# Altium integrated library Transistor-SMD_V2.IntLib: 415 symbols (part 2 of 2)
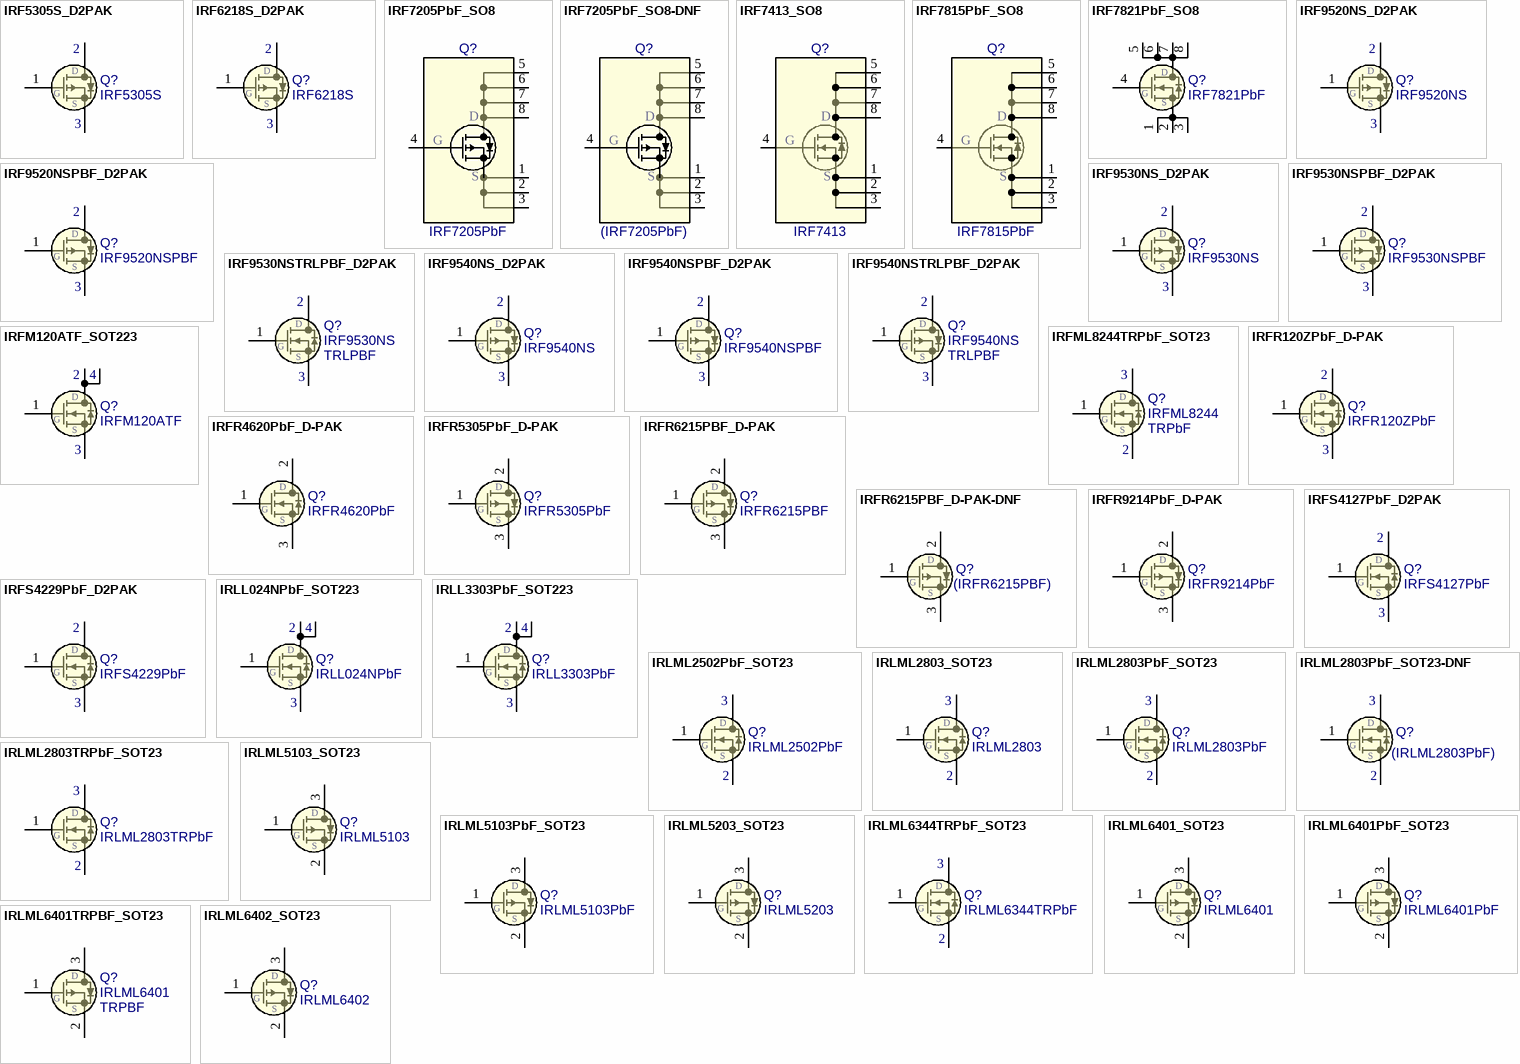
[diagram p11: symbols IRF5305S_D2PAK to IRLML6402_SOT23]

## IRLML6402_SOT23
designator Q?, comment IRLML6402
FET P-Channel 3.7A 20V; Manufacturer: IRF; Package: SOT23; EDM-PN: *; Text2: *; Text1: *; Value: IRLML6402; SAAB PN: *; Part Number: IRLML6402; DCE Part No: *
footprint SOT23 (SOT23, 3-Leads, Body 3.0x1.4mm (max), Pitch 0.95mm, IPC Medium Density)
pins: 1 G, 2 S, 3 D

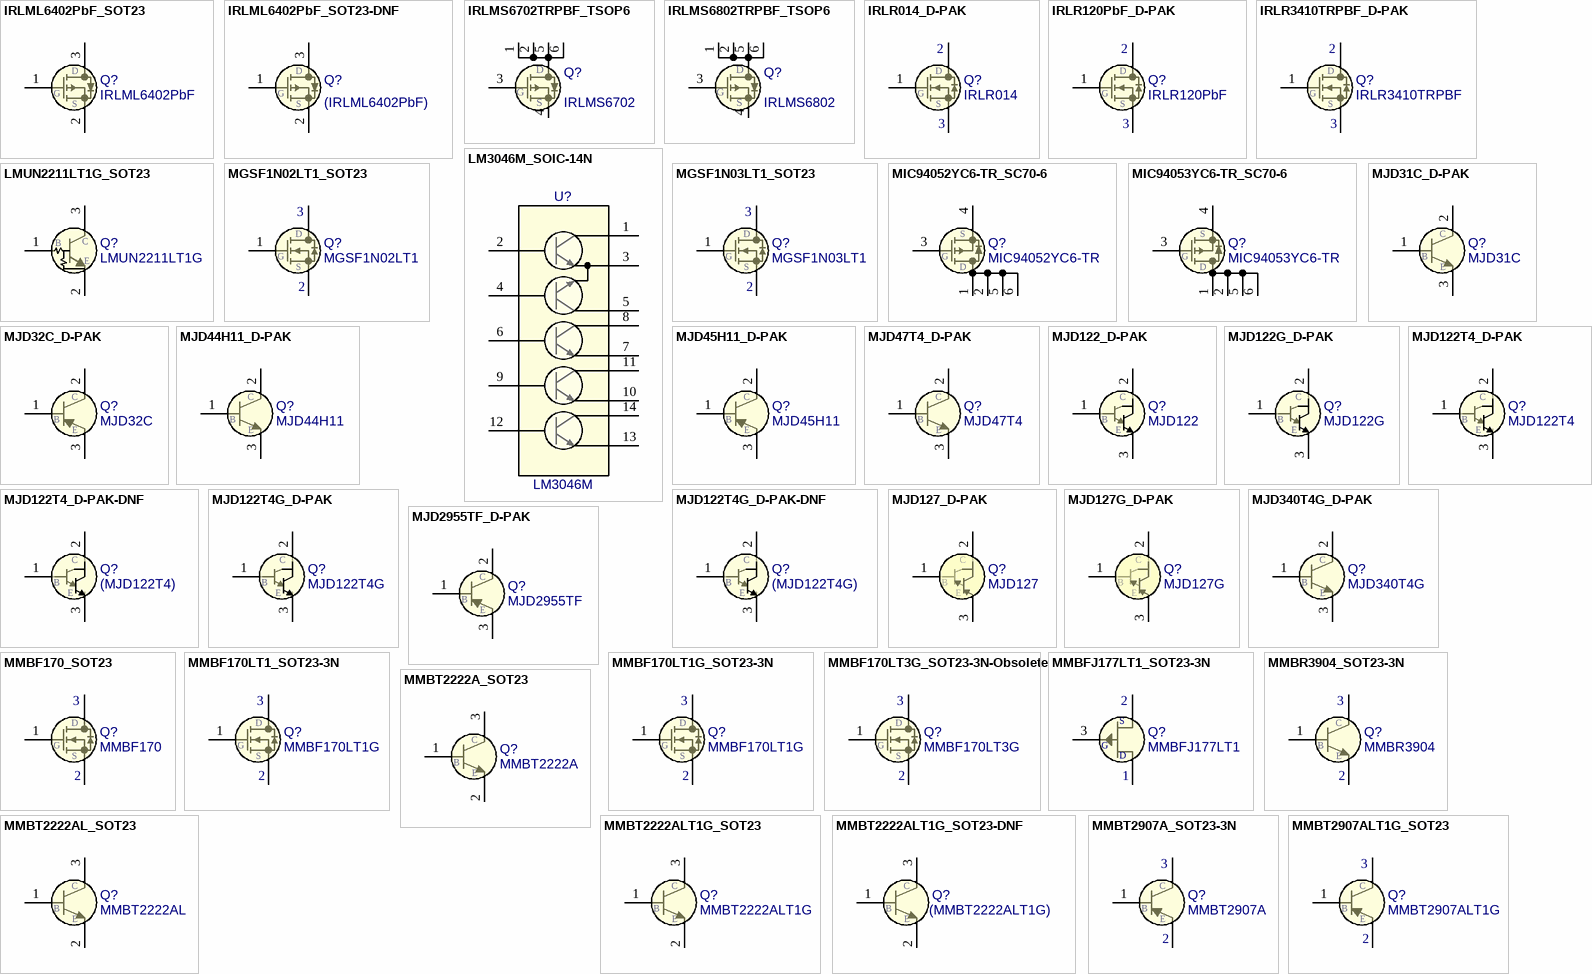
[diagram p6: symbols IRLML6402PbF_SOT23 to MMBT2907ALT1G_SOT23]

## IRLML6402PbF_SOT23
designator Q?, comment IRLML6402PbF
FET P-Channel 3.7A 20V; Manufacturer: IRF; Package: SOT23; EDM-PN: *; Text2: *; Text1: *; Value: IRLML6402PbF; SAAB PN: *; DCE Part No: *; Part Number: IRLML6402PbF
footprint SOT23 (SOT23, 3-Leads, Body 3.0x1.4mm (max), Pitch 0.95mm, IPC Medium Density)
pins: 1 G, 2 S, 3 D

## IRLML6402PbF_SOT23-DNF
designator Q?, comment value (IRLML6402PbF)  (hidden comment: IRLML6402PbF)
FET P-Channel 3.7A 20V - Do not Fit; Manufacturer: IRF; Package: SOT23; EDM-PN: *; Text2: *; Text1: *; SAAB PN: *; Part Number: IRLML6402PbF; DCE Part No: *
footprint SOT23 (SOT23, 3-Leads, Body 3.0x1.4mm (max), Pitch 0.95mm, IPC Medium Density)
pins: 1 G, 2 S, 3 D

## IRLMS6702TRPBF_TSOP6
designator Q?, comment value IRLMS6702  (hidden comment: IRLMS6702TRPBF)
FET P-Channel 20V 2.4A; Manufacturer: Infineon; EDM-PN: FET185; Package: TSOP-6; Text2: *; Text1: *; SAAB PN: *; Part Number: IRLMS6702TRPBF; DCE Part No: *
footprint TSOP-6 (SOT23, 6-Leads, Body 3.0x2.9mm (max), Pitch 0.95mm, IPC Medium Density)
pins: 1 D, 2 D, 3 G, 4 S, 5 D, 6 D

## IRLMS6802TRPBF_TSOP6
designator Q?, comment value IRLMS6802  (hidden comment: IRLMS6802TRPBF)
FET P-Channel 20V 5.6A; Manufacturer: Infineon; EDM-PN: FET186; Package: TSOP-6; Text2: *; Text1: *; SAAB PN: *; Part Number: IRLMS6802TRPBF; DCE Part No: *
footprint TSOP-6 (SOT23, 6-Leads, Body 3.0x2.9mm (max), Pitch 0.95mm, IPC Medium Density)
pins: 1 D, 2 D, 3 G, 4 S, 5 D, 6 D

## IRLR014_D-PAK
designator Q?, comment IRLR014
FET N-Channel 60V 7.7A; Manufacturer: IRF/Vishay; Package: D-PAK-3; EDM-PN: *; Text2: *; Text1: *; Value: IRLR014; SAAB PN: *; DCE Part No: *; Part Number: IRLR014
footprint D-PAK-3 (D-Pak 6.73x6.22mm)
pins: 1 G, 2 D, 3 S

## IRLR120PbF_D-PAK
designator Q?, comment IRLR120PbF
FET N-Channel 100V 7.7A; Manufacturer: Vishay; Package: D-PAK-3; EDM-PN: *; Text2: *; Text1: *; Value: IRLR120PbF; SAAB PN: *; DCE Part No: *; Part Number: IRLR120PbF
footprint D-PAK-3 (D-Pak 6.73x6.22mm)
pins: 1 G, 2 D, 3 S

## IRLR3410TRPBF_D-PAK
designator Q?, comment IRLR3410TRPBF
FET N-Channel 100V 17A; Manufacturer: IRF; Reutech PN: 5961-FE-0088; Package: D-PAK-3; EDM-PN: *; Text2: *; Text1: *; Value: IRLR3410TRPBF; SAAB PN: *; DCE Part No: *; Part Number: IRLR3410TRPBF
footprint D-PAK-3 (D-Pak 6.73x6.22mm)
pins: 1 G, 2 D, 3 S

## LM3046M_SOIC-14N
designator U?, comment LM3046M
Transistor Array; Manufacturer: National Semi; Package: SOIC127P600X180-14N; EDM-PN: *; Text2: *; Text1: *; Value: LM3046M; SAAB PN: *; DCE Part No: *; Part Number: LM3046M
footprint SO14 (SOIC, 14-Leads, Body 8.8x4.0mm (max), Pitch 1.27mm, IPC Medium Density)
pins: 1, 2, 3, 4, 5, 6, 7, 8, 9, 10, 11, 12, 13, 14

## LMUN2211LT1G_SOT23
designator Q?, comment LMUN2211LT1G
Transistor NPN Pre-Biased 50V 100mA 10K-10K; Manufacturer: LRC; Package: SOT23; EDM-PN: *; Text2: *; Text1: *; Value: LMUN2211LT1G; SAAB PN: *; DCE Part No: *; Part Number: LMUN2211LT1G
footprint SOT23 (SOT23, 3-Leads, Body 3.0x1.4mm (max), Pitch 0.95mm, IPC Medium Density)
pins: 1 B, 2 E, 3 C

## MGSF1N02LT1_SOT23
designator Q?, comment MGSF1N02LT1
FET N-Channel 750mA 20V; Manufacturer: On Semi; Package: SOT23; EDM-PN: *; Text2: *; Text1: *; Value: MGSF1N02LT1; SAAB PN: *; DCE Part No: *; Part Number: MGSF1N02LT1
footprint SOT23 (SOT23, 3-Leads, Body 3.0x1.4mm (max), Pitch 0.95mm, IPC Medium Density)
pins: 1 G, 2 S, 3 D

## MGSF1N03LT1_SOT23
designator Q?, comment MGSF1N03LT1
FET N-Channel 2.1A 30V; Manufacturer: On Semi; Package: SOT23; EDM-PN: *; Text2: *; Text1: *; Value: MGSF1N03LT1; SAAB PN: *; DCE Part No: *; Part Number: MGSF1N03LT1
footprint SOT23 (SOT23, 3-Leads, Body 3.0x1.4mm (max), Pitch 0.95mm, IPC Medium Density)
pins: 1 G, 2 S, 3 D

## MIC94052YC6-TR_SC70-6
designator Q?, comment MIC94052YC6-TR
FET P-Channel 2A 6V; Manufacturer: Microchip; Package: SC70-6; EDM-PN: *; Text2: *; Text1: *; Value: MIC94052YC6-TR; SAAB PN: *; DCE Part No: *; Part Number: MIC94052YC6-TR
footprint SC70-6 (SC70, 6-Leads, Body 2.2x1.4mm (max), Pitch 0.65mm, IPC Medium Density)
pins: 1 D, 2 D, 3 G, 4 S, 5 D, 6 D

## MIC94053YC6-TR_SC70-6
designator Q?, comment MIC94053YC6-TR
FET P-Channel 2A 6V; Manufacturer: Microchip; Package: SC70-6; EDM-PN: *; Text2: *; Text1: *; Value: MIC94053YC6-TR; SAAB PN: *; DCE Part No: *; Part Number: MIC94053YC6-TR
footprint SC70-6 (SC70, 6-Leads, Body 2.2x1.4mm (max), Pitch 0.65mm, IPC Medium Density)
pins: 1 D, 2 D, 3 G, 4 S, 5 D, 6 D

## MJD31C_D-PAK
designator Q?, comment MJD31C
Transistor NPN Power 100V 3A; Manufacturer: Various; Package: D-PAK-3; EDM-PN: *; Text2: *; Text1: *; Value: MJD31C; SAAB PN: *; DCE Part No: *; Part Number: MJD31C
footprint D-PAK-3 (D-PAK 3 6.73x6.22mm)
pins: 1 B, 2 C, 3 E

## MJD32C_D-PAK
designator Q?, comment MJD32C
Transistor PNP Power 100V 3A; Manufacturer: Variuos; Package: D-PAK-3; EDM-PN: *; Text2: *; Text1: *; Value: MJD32C; SAAB PN: *; DCE Part No: *; Part Number: MJD32C
footprint D-PAK-3 (D-PAK 3 6.73x6.22mm)
pins: 1 B, 2 C, 3 E

## MJD44H11_D-PAK
designator Q?, comment MJD44H11
Transistor NPN Power 80V 8A; Manufacturer: On Semi; EDM-PN: TRN129; Package: D-PAK-3; Text2: *; Text1: *; Value: MJD44H11; SAAB PN: *; DCE Part No: *; Part Number: MJD44H11
footprint D-PAK-3 (D-PAK 3 6.73x6.22mm)
pins: 1 B, 2 C, 3 E

## MJD45H11_D-PAK
designator Q?, comment MJD45H11
Transistor PNP Power 80V 8A; Manufacturer: On Semi; Package: D-PAK-3; EDM-PN: *; Text2: *; Text1: *; Value: MJD45H11; SAAB PN: *; DCE Part No: *; Part Number: MJD45H11
footprint D-PAK-3 (D-PAK 3 6.73x6.22mm)
pins: 1 B, 2 C, 3 E

## MJD47T4_D-PAK
designator Q?, comment MJD47T4
Transistor NPN Power 250V 1A; Manufacturer: STM; Package: D-PAK-3; EDM-PN: *; Text2: *; Text1: *; Value: MJD47T4; SAAB PN: *; DCE Part No: *; Part Number: MJD47T4
footprint D-PAK-3 (D-PAK 3 6.73x6.22mm)
pins: 1 B, 2 C, 3 E

## MJD122_D-PAK
designator Q?, comment MJD122
Transistor NPN Darlington 100V 8A; Manufacturer: Various; Package: D-PAK-3; EDM-PN: *; Text2: *; Text1: *; Value: MJD122; SAAB PN: *; DCE Part No: *; Part Number: MJD122
footprint D-PAK-3 (D-PAK 3 6.73x6.22mm)
pins: 1 B, 2 C, 3 E

## MJD122G_D-PAK
designator Q?, comment MJD122G
Transistor NPN Darlington 100V 8A; Manufacturer: On Semi; Package: D-PAK-3; EDM-PN: *; Text2: *; Text1: *; Value: MJD122G; SAAB PN: *; DCE Part No: *; Part Number: MJD122G
footprint D-PAK-3 (D-PAK 3 6.73x6.22mm)
pins: 1 B, 2 C, 3 E

## MJD122T4_D-PAK
designator Q?, comment MJD122T4
Transistor NPN Darlington 100V 8A; Manufacturer: On Semi; EDM-PN: TRN151; Package: D-PAK-3; Text2: *; Text1: *; Value: MJD122T4; SAAB PN: *; DCE Part No: *; Part Number: MJD122T4
footprint D-PAK-3 (D-PAK 3 6.73x6.22mm)
pins: 1 B, 2 C, 3 E

## MJD122T4_D-PAK-DNF
designator Q?, comment value (MJD122T4)  (hidden comment: MJD122T4)
Transistor NPN Darlington 100V 8A - Do not Fit; Manufacturer: On Semi; Part Number: DNF - MJD122T4; EDM-PN: TRN151; Package: D-PAK-3; Text2: *; Text1: *; SAAB PN: *; DCE Part No: *
footprint D-PAK-3 (D-PAK 3 6.73x6.22mm)
pins: 1 B, 2 C, 3 E

## MJD122T4G_D-PAK
designator Q?, comment MJD122T4G
Transistor NPN Darlington 100V 8A; Manufacturer: On Semi; EDM-PN: TRN151; Package: D-PAK-3; Text2: *; Text1: *; Value: MJD122T4G; SAAB PN: *; DCE Part No: *; Part Number: MJD122T4G
footprint D-PAK-3 (D-PAK 3 6.73x6.22mm)
pins: 1 B, 2 C, 3 E

## MJD122T4G_D-PAK-DNF
designator Q?, comment value (MJD122T4G)  (hidden comment: MJD122T4G)
Transistor NPN Darlington 100V 8A - Do not Fit; Manufacturer: On Semi; Part Number: DNF - MJD122T4G; EDM-PN: TRN151; Package: D-PAK-3; Text2: *; Text1: *; SAAB PN: *; DCE Part No: *
footprint D-PAK-3 (D-PAK 3 6.73x6.22mm)
pins: 1 B, 2 C, 3 E

## MJD127_D-PAK
designator Q?, comment MJD127
Transistor PNP Darlington 100V 8A; Manufacturer: Variuos; Package: D-PAK-3; EDM-PN: *; Text2: *; Text1: *; Value: MJD127; SAAB PN: *; DCE Part No: *; Part Number: MJD127
footprint D-PAK-3 (D-PAK 3 6.73x6.22mm)
pins: 1 B, 2 C, 3 E

## MJD127G_D-PAK
designator Q?, comment MJD127G
Transistor PNP Darlington 100V 8A; Manufacturer: Variuos; Package: D-PAK-3; EDM-PN: *; Text2: *; Text1: *; Value: MJD127G; SAAB PN: *; DCE Part No: *; Part Number: MJD127G
footprint D-PAK-3 (D-PAK 3 6.73x6.22mm)
pins: 1 B, 2 C, 3 E

## MJD340T4G_D-PAK
designator Q?, comment MJD340T4G
Transistor NPN Power 300V 500mA; Manufacturer: On Semi; Package: D-PAK-3; EDM-PN: *; Text2: *; Text1: *; Value: MJD340T4G; SAAB PN: *; DCE Part No: *; Part Number: MJD340T4G
footprint D-PAK-3 (D-PAK 3 6.73x6.22mm)
pins: 1 B, 2 C, 3 E

## MJD2955TF_D-PAK
designator Q?, comment MJD2955TF
Transistor PNP General Purpose Amplifier; Manufacturer: Fairchild; Package: D-PAK-3; EDM-PN: *; Text2: *; Text1: *; Value: MJD2955TF; SAAB PN: *; DCE Part No: *; Part Number: MJD2955TF
footprint D-PAK-3 (D-PAK 3 6.73x6.22mm)
pins: 1 B, 2 C, 3 E

## MMBF170_SOT23
designator Q?, comment MMBF170
FET N-Channel 60V 500mA; Manufacturer: Various; EDM-PN: FET44; Package: SOT23; Text2: *; Text1: *; Value: MMBF170; SAAB PN: *; DCE Part No: *; Part Number: MMBF170
footprint SOT23 (SOT23, 3-Leads, Body 3.0x1.4mm (max), Pitch 0.95mm, IPC Medium Density)
pins: 1 G, 2 S, 3 D

## MMBF170LT1_SOT23-3N
designator Q?, comment Part Number: MMBF170LT1G  (hidden comment: MMBF170LT1)
FET N-Channel 60V 500mA; Manufacturer: On Semi; EDM-PN: FET177; Value: MMBF170LT1G; Package: SOT23; Text2: *; Text1: *; SAAB PN: *; DCE Part No: *
footprint SOT23 (SOT23, 3-Leads, Body 3.0x1.4mm (max), Pitch 0.95mm, IPC Medium Density)
pins: 1 G, 2 S, 3 D

## MMBF170LT1G_SOT23-3N
designator Q?, comment MMBF170LT1G
FET N-Channel 60V 500mA; Manufacturer: On Semi; EDM-PN: FET177; Package: SOT23; Text2: *; Text1: *; Value: MMBF170LT1G; SAAB PN: *; DCE Part No: *; Part Number: MMBF170LT1G
footprint SOT23 (SOT23, 3-Leads, Body 3.0x1.4mm (max), Pitch 0.95mm, IPC Medium Density)
pins: 1 G, 2 S, 3 D

## MMBF170LT3G_SOT23-3N-Obsolete
designator Q?, comment MMBF170LT3G
FET N-Channel 60V 500mA; Manufacturer: On Semi; Package: SOT23; EDM-PN: *; Text2: *; Text1: *; Value: MMBF170LT3G; SAAB PN: *; DCE Part No: *; Part Number: MMBF170LT3G
footprint SOT23 (SOT23, 3-Leads, Body 3.0x1.4mm (max), Pitch 0.95mm, IPC Medium Density)
pins: 1 G, 2 S, 3 D

## MMBFJ177LT1_SOT23-3N
designator Q?, comment MMBFJ177LT1
JFET Chopper P-Channel 225mW 25V; Manufacturer: On Semi; Package: SOT23; EDM-PN: *; Text2: *; Text1: *; Value: MMBFJ177LT1; SAAB PN: *; DCE Part No: *; Part Number: MMBFJ177LT1
footprint SOT23 (SOT23, 3-Leads, Body 3.0x1.4mm (max), Pitch 0.95mm, IPC Medium Density)
pins: 1 D, 2 S, 3 G

## MMBR3904_SOT23-3N
designator Q?, comment MMBR3904
Transistor NPN Switching; Manufacturer: Motorola; Package: SOT23; EDM-PN: *; Text2: *; Text1: *; Value: MMBR3904; SAAB PN: *; DCE Part No: *; Part Number: MMBR3904
footprint SOT23 (SOT23, 3-Leads, Body 3.0x1.4mm (max), Pitch 0.95mm, IPC Medium Density)
pins: 1 B, 2 E, 3 C

## MMBT2222A_SOT23
designator Q?, comment MMBT2222A
Transistor NPN General Purpose; Manufacturer: Various; EDM-PN: TRN3; Package: SOT23; Text2: *; Text1: *; Value: MMBT2222A; SAAB PN: *; DCE Part No: *; Part Number: MMBT2222A
footprint SOT23 (SOT23, 3-Leads, Body 3.0x1.4mm (max), Pitch 0.95mm, IPC Medium Density)
pins: 1 B, 2 E, 3 C

## MMBT2222AL_SOT23
designator Q?, comment MMBT2222AL
Transistor NPN General Purpose; Manufacturer: Various; Package: SOT23; EDM-PN: *; Text2: *; Text1: *; Value: MMBT2222AL; SAAB PN: *; DCE Part No: *; Part Number: MMBT2222AL
footprint SOT23 (SOT23, 3-Leads, Body 3.0x1.4mm (max), Pitch 0.95mm, IPC Medium Density)
pins: 1 B, 2 E, 3 C

## MMBT2222ALT1G_SOT23
designator Q?, comment MMBT2222ALT1G
Transistor NPN General Purpose; Manufacturer: On Semi; Package: SOT23; EDM-PN: *; Text2: *; Text1: *; Value: MMBT2222ALT1G; SAAB PN: *; DCE Part No: *; Part Number: MMBT2222ALT1G
footprint SOT23 (SOT23, 3-Leads, Body 3.0x1.4mm (max), Pitch 0.95mm, IPC Medium Density)
pins: 1 B, 2 E, 3 C

## MMBT2222ALT1G_SOT23-DNF
designator Q?, comment value (MMBT2222ALT1G)  (hidden comment: MMBT2222ALT1G)
Transistor NPN General Purpose - Do not Fit; Manufacturer: On Semi; Part Number: DNF - MMBT2222ALT1G; Package: SOT23; EDM-PN: *; Text2: *; Text1: *; SAAB PN: *; DCE Part No: *
footprint SOT23 (SOT23, 3-Leads, Body 3.0x1.4mm (max), Pitch 0.95mm, IPC Medium Density)
pins: 1 B, 2 E, 3 C

## MMBT2907A_SOT23-3N
designator Q?, comment MMBT2907A
Transistor PNP General Purpose Amplifier; Manufacturer: Motorola; Package: SOT23; EDM-PN: *; Text2: *; Text1: *; Value: MMBT2907A; SAAB PN: *; DCE Part No: *; Part Number: MMBT2907A
footprint SOT23 (SOT23, 3-Leads, Body 3.0x1.4mm (max), Pitch 0.95mm, IPC Medium Density)
pins: 1 B, 2 E, 3 C

## MMBT2907ALT1G_SOT23
designator Q?, comment MMBT2907ALT1G
Transistor PNP General Purpose Amplifier; Manufacturer: On Semi; Package: SOT23; EDM-PN: *; Text2: *; Text1: *; Value: MMBT2907ALT1G; SAAB PN: *; DCE Part No: *; Part Number: MMBT2907ALT1G
footprint SOT23 (SOT23, 3-Leads, Body 3.0x1.4mm (max), Pitch 0.95mm, IPC Medium Density)
pins: 1 B, 2 E, 3 C

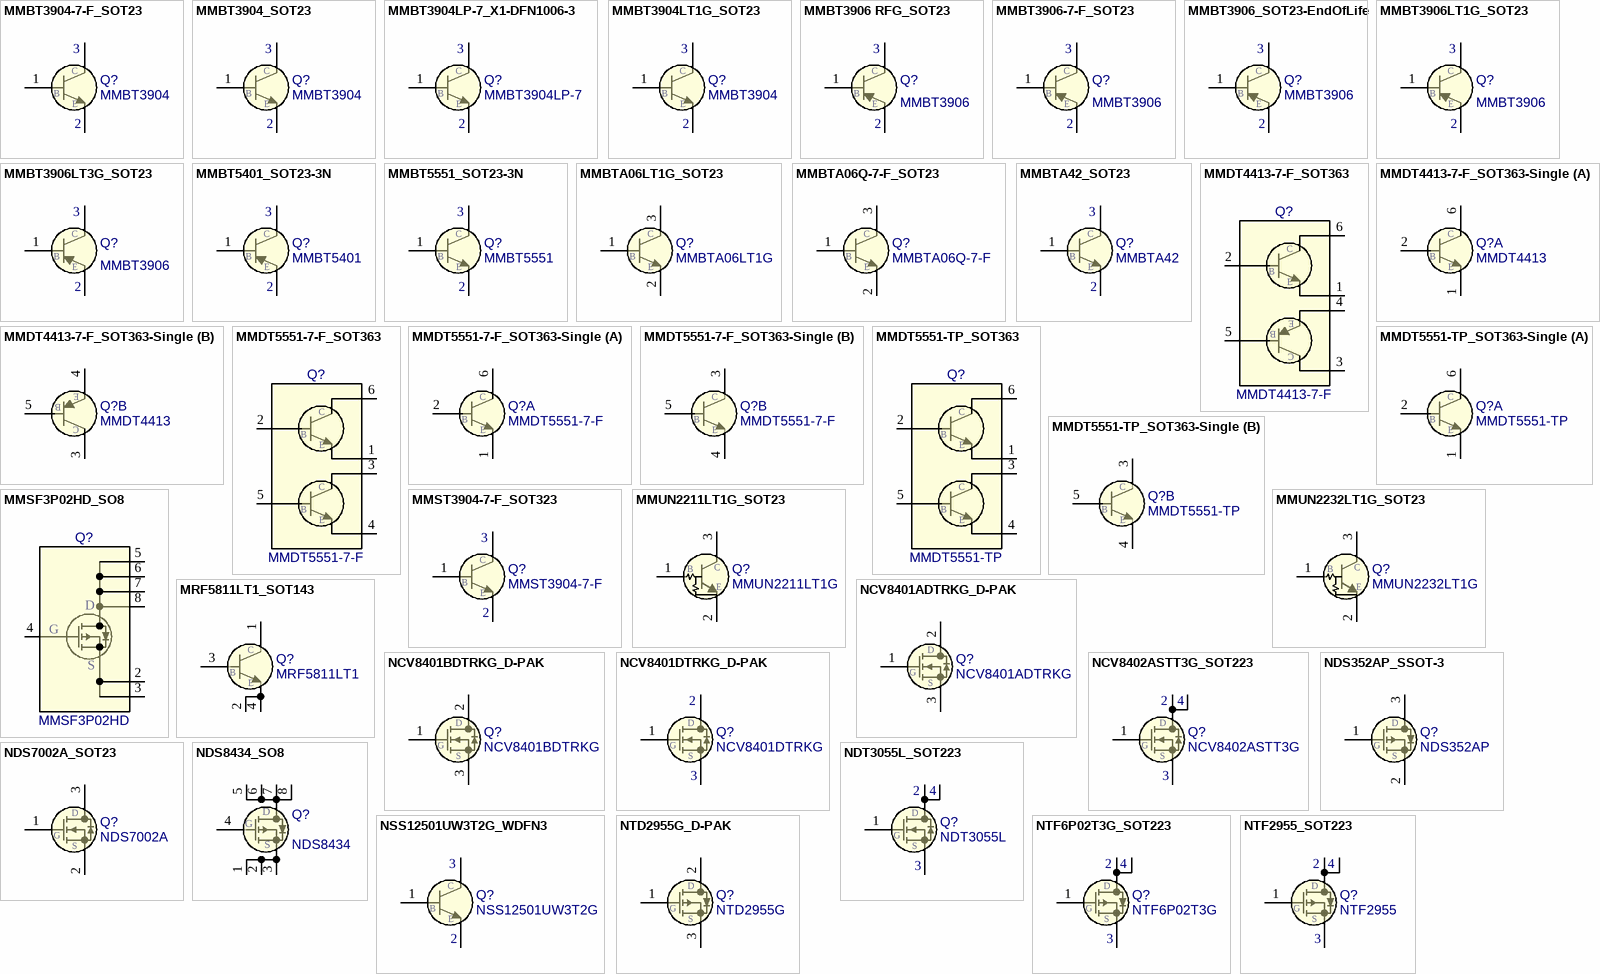
[diagram p7: symbols MMBT3904-7-F_SOT23 to NTF2955_SOT223]

## MMBT3904-7-F_SOT23
designator Q?, comment value MMBT3904  (hidden comment: MMBT3904-7-F)
Transistor NPN 40V 200mA; Manufacturer: Diodes; EDM-PN: TRN39; Package: SOT23; Text2: *; Text1: *; SAAB PN: *; Part Number: MMBT3904-7-F; DCE Part No: *
footprint SOT23 (SOT23, 3-Leads, Body 3.0x1.4mm (max), Pitch 0.95mm, IPC Medium Density)
pins: 1 B, 2 E, 3 C

## MMBT3904_SOT23
designator Q?, comment MMBT3904
Transistor NPN 40V 200mA; Manufacturer: On Semi; EDM-PN: TRN39; Package: SOT23; Text2: *; Text1: *; Value: MMBT3904; SAAB PN: *; DCE Part No: *; Part Number: MMBT3904
footprint SOT23 (SOT23, 3-Leads, Body 3.0x1.4mm (max), Pitch 0.95mm, IPC Medium Density)
pins: 1 B, 2 E, 3 C

## MMBT3904LP-7_X1-DFN1006-3
designator Q?, comment MMBT3904LP-7
Transistor NPN 40V 200mA; Manufacturer: Diodes; Package: X1-DFN1006-3; EDM-PN: *; Text2: *; Text1: *; Value: MMBT3904LP-7; SAAB PN: *; DCE Part No: *; Part Number: MMBT3904LP-7
footprint X1-DFN1006-3 (DFN1006-3 0.6x1.0mm)
pins: 1 B, 2 E, 3 C

## MMBT3904LT1G_SOT23
designator Q?, comment value MMBT3904  (hidden comment: MMBT3904LT1G)
Transistor NPN 40V 200mA; Manufacturer: On Semi; EDM-PN: TRN39; Package: SOT23; Text2: *; Text1: *; SAAB PN: *; Part Number: MMBT3904LT1G; DCE Part No: *
footprint SOT23 (SOT23, 3-Leads, Body 3.0x1.4mm (max), Pitch 0.95mm, IPC Medium Density)
pins: 1 B, 2 E, 3 C

## MMBT3906 RFG_SOT23
designator Q?, comment value MMBT3906  (hidden comment: MMMBT3906 RFG)
Transistor PNP 40V 200mA; Manufacturer: Taiwan Semi; EDM-PN: TR26; Package: SOT23; Text2: *; Text1: *; SAAB PN: *; Part Number: MMBT3906 RFG; DCE Part No: *
footprint SOT23 (SOT23, 3-Leads, Body 3.0x1.4mm (max), Pitch 0.95mm, IPC Medium Density)
pins: 1 B, 2 E, 3 C

## MMBT3906-7-F_SOT23
designator Q?, comment value MMBT3906  (hidden comment: MMBT3906-7-F)
Transistor PNP 40V 200mA; Manufacturer: Diodes; EDM-PN: TR26; Package: SOT23; Text2: *; Text1: *; SAAB PN: *; Part Number: MMBT3906-7-F; DCE Part No: *
footprint SOT23 (SOT23, 3-Leads, Body 3.0x1.4mm (max), Pitch 0.95mm, IPC Medium Density)
pins: 1 B, 2 E, 3 C

## MMBT3906_SOT23-EndOfLife
designator Q?, comment MMBT3906
Transistor PNP General Purpose Amplifier; Manufacturer: On Semi; EDM-PN: TRN26; Package: SOT23; Text2: *; Text1: *; Value: MMBT3906; SAAB PN: *; DCE Part No: *; Part Number: MMBT3906
footprint SOT23 (SOT23, 3-Leads, Body 3.0x1.4mm (max), Pitch 0.95mm, IPC Medium Density)
pins: 1 B, 2 E, 3 C

## MMBT3906LT1G_SOT23
designator Q?, comment value MMBT3906  (hidden comment: MMBT3906LT1G)
Transistor PNP 40V 200mA; Manufacturer: On Semi; EDM-PN: TR26; Package: SOT23; Text2: *; Text1: *; SAAB PN: *; Part Number: MMBT3906LT1G; DCE Part No: *
footprint SOT23 (SOT23, 3-Leads, Body 3.0x1.4mm (max), Pitch 0.95mm, IPC Medium Density)
pins: 1 B, 2 E, 3 C

## MMBT3906LT3G_SOT23
designator Q?, comment value MMBT3906  (hidden comment: MMBT3906LT3G)
Transistor PNP 40V 200mA; Manufacturer: On Semi; EDM-PN: TR26; Package: SOT23; Text2: *; Text1: *; SAAB PN: *; Part Number: MMBT3906LT3G; DCE Part No: *
footprint SOT23 (SOT23, 3-Leads, Body 3.0x1.4mm (max), Pitch 0.95mm, IPC Medium Density)
pins: 1 B, 2 E, 3 C

## MMBT5401_SOT23-3N
designator Q?, comment MMBT5401
Transistor PNP General Purpose Amplifier; Manufacturer: Fairchild; Package: SOT23; EDM-PN: *; Text2: *; Text1: *; Value: MMBT5401; SAAB PN: *; DCE Part No: *; Part Number: MMBT5401
footprint SOT23 (SOT23, 3-Leads, Body 3.0x1.4mm (max), Pitch 0.95mm, IPC Medium Density)
pins: 1 B, 2 E, 3 C

## MMBT5551_SOT23-3N
designator Q?, comment MMBT5551
Transistor NPN General Purpose Amplifier; Manufacturer: Fairchild; Package: SOT23; EDM-PN: *; Text2: *; Text1: *; Value: MMBT5551; SAAB PN: *; DCE Part No: *; Part Number: MMBT5551
footprint SOT23 (SOT23, 3-Leads, Body 3.0x1.4mm (max), Pitch 0.95mm, IPC Medium Density)
pins: 1 B, 2 E, 3 C

## MMBTA06LT1G_SOT23
designator Q?, comment MMBTA06LT1G
Transistor NPN 500mA 80V; Manufacturer: On Semi; Package: SOT23; EDM-PN: *; Text2: *; Text1: *; Value: MMBTA06LT1G; SAAB PN: *; DCE Part No: *; Part Number: MMBTA06LT1G
footprint SOT23 (SOT23, 3-Leads, Body 3.0x1.4mm (max), Pitch 0.95mm, IPC Medium Density)
pins: 1 B, 2 E, 3 C

## MMBTA06Q-7-F_SOT23
designator Q?, comment MMBTA06Q-7-F
Transistor NPN 80V 500mA; Manufacturer: Diodes; Reutech PN: 5961-TR-0053; Package: SOT23; EDM-PN: *; Text2: *; Text1: *; Value: MMBTA06Q-7-F; SAAB PN: *; DCE Part No: *; Part Number: MMBTA06Q-7-F
footprint SOT23 (SOT23, 3-Leads, Body 3.0x1.4mm (max), Pitch 0.95mm, IPC Medium Density)
pins: 1 B, 2 E, 3 C

## MMBTA42_SOT23
designator Q?, comment MMBTA42
Transistor NPN High Voltage Amplifier; Manufacturer: Various; EDM-PN: TRN3; Package: SOT23; Text2: *; Text1: *; Value: MMBTA42; SAAB PN: *; DCE Part No: *; Part Number: MMBTA42
footprint SOT23 (SOT23, 3-Leads, Body 3.0x1.4mm (max), Pitch 0.95mm, IPC Medium Density)
pins: 1 B, 2 E, 3 C

## MMDT4413-7-F_SOT363
designator Q?, comment MMDT4413-7-F
Transistor NPN/PNP 40V 600mA; Manufacturer: Diodes; Package: SOT363-6; EDM-PN: *; Text2: *; Text1: *; Value: MMDT4413-7-F; SAAB PN: *; DCE Part No: *; Part Number: MMDT4413-7-F
footprint SOT363-6 (SOT363 1.35x2.2mm 6lead)
pins: 1, 2, 3, 4, 5, 6
text: C; B; E

## MMDT4413-7-F_SOT363-Single
designator Q?, comment value MMDT4413  (hidden comment: MMDT4413-7-F)
Transistor NPN/PNP 40V 600mA; Manufacturer: Diodes; Package: SOT363-6; EDM-PN: *; Text2: *; Text1: *; SAAB PN: *; Part Number: MMDT4413-7-F; DCE Part No: *
footprint SOT363-6 (SOT363 1.35x2.2mm 6lead)
part A pins: 1, 2, 6
part B pins: 3, 4, 5
part A text: C; B; E
part B text: E; B; C

## MMDT5551-7-F_SOT363
designator Q?, comment MMDT5551-7-F
Transistor NPN/NPN 160V 200mA; Manufacturer: Diodes; Package: SOT363-6; Text2: *; Text1: *; Value: MMDT5551-7-F; SAAB PN: *; DCE Part No: *; Part Number: MMDT5551-7-F
footprint SOT363-6 (SOT363 1.35x2.2mm 6lead)
pins: 1, 2, 3, 4, 5, 6
text: C; B; E

## MMDT5551-7-F_SOT363-Single
designator Q?, comment MMDT5551-7-F
Transistor NPN/NPN 160V 200mA; Manufacturer: Diodes; Package: SOT363-6; Text2: *; Text1: *; SAAB PN: *; Part Number: MMDT5551-7-F; DCE Part No: *; Value: MMDT5551-7-F
footprint SOT363-6 (SOT363 1.35x2.2mm 6lead)
part A pins: 1, 2, 6
part B pins: 3, 4, 5
part A text: C; B; E
part B text: C; B; E

## MMDT5551-TP_SOT363
designator Q?, comment MMDT5551-TP
Transistor NPN/NPN 160V 200mA; Manufacturer: Micro Comm; EDM-PN: TRN150; Package: SOT363-6; Text2: *; Text1: *; Value: MMDT5551-TP; SAAB PN: *; DCE Part No: *; Part Number: MMDT5551-TP
footprint SOT363-6 (SOT363 1.35x2.2mm 6lead)
pins: 1, 2, 3, 4, 5, 6
text: C; B; E

## MMDT5551-TP_SOT363-Single
designator Q?, comment MMDT5551-TP
Transistor NPN/NPN 160V 200mA; Manufacturer: Micro Comm; EDM-PN: TRN150; Package: SOT363-6; Text2: *; Text1: *; SAAB PN: *; Part Number: MMDT5551-TP; DCE Part No: *; Value: MMDT5551-TP
footprint SOT363-6 (SOT363 1.35x2.2mm 6lead)
part A pins: 1, 2, 6
part B pins: 3, 4, 5
part A text: C; B; E
part B text: C; B; E

## MMSF3P02HD_SO8
designator Q?, comment MMSF3P02HD
FET P-Channel 3A 20V; Manufacturer: On Semi; Package: SO8; EDM-PN: *; Text2: *; Text1: *; Value: MMSF3P02HD; SAAB PN: *; DCE Part No: *; Part Number: MMSF3P02HD
footprint SO8 (SOIC, 8-Leads, Body 5.0x4.0mm (max), Pitch 1.27mm, IPC Medium Density)
pins: 2 S, 3 S, 4 G, 5 D, 6 D, 7 D, 8 D

## MMST3904-7-F_SOT323
designator Q?, comment MMST3904-7-F
Transistor NPN 40V 200mA; Manufacturer: Diodes; Package: SOT323; EDM-PN: *; Text2: *; Text1: *; SAAB PN: *; Part Number: MMST3904-7-F; DCE Part No: *; Value: MMST3904-7-F
footprint SOT323 (SOT323 2.2x1.3mm)
pins: 1 B, 2 E, 3 C

## MMUN2211LT1G_SOT23
designator Q?, comment MMUN2211LT1G
Transistor NPN Pre-Biased 50V 100mA; Manufacturer: On Semi; Package: SOT23; EDM-PN: *; Text2: *; Text1: *; Value: MMUN2211LT1G; SAAB PN: *; DCE Part No: *; Part Number: MMUN2211LT1G
footprint SOT23 (SOT23, 3-Leads, Body 3.0x1.4mm (max), Pitch 0.95mm, IPC Medium Density)
pins: 1 B, 2 E, 3 C

## MMUN2232LT1G_SOT23
designator Q?, comment MMUN2232LT1G
Transistor NPN Pre-Biased 50V 100mA; Manufacturer: On Semi; Package: SOT23; EDM-PN: *; Text2: *; Text1: *; Value: MMUN2232LT1G; SAAB PN: *; DCE Part No: *; Part Number: MMUN2232LT1G
footprint SOT23 (SOT23, 3-Leads, Body 3.0x1.4mm (max), Pitch 0.95mm, IPC Medium Density)
pins: 1 B, 2 E, 3 C

## MRF5811LT1_SOT143
designator Q?, comment MRF5811LT1
Transistor NPN UHF Band RF Small Signal; Manufacturer: Mororola; Package: SOT143; EDM-PN: *; Text2: *; Text1: *; Value: MRF5811LT1; SAAB PN: *; DCE Part No: *; Part Number: MRF5811LT1
footprint SOT143 (SOT143 2.9x1.3mm)
pins: 1 C, 2 E, 3 B, 4 E

## NCV8401ADTRKG_D-PAK
designator Q?, comment NCV8401ADTRKG
FET N-Channel Low Side  Driver 33A 42V; Manufacturer: On Semi; Package: D-PAK-3; EDM-PN: *; Text2: *; Text1: *; Value: NCV8401ADTRKG; SAAB PN: *; DCE Part No: *; Part Number: NCV8401ADTRKG
footprint D-PAK-3 (D-Pak 6.73x6.22mm)
pins: 1 G, 2 D, 3 S

## NCV8401BDTRKG_D-PAK
designator Q?, comment NCV8401BDTRKG
FET N-Channel Low Side  Driver 30A 42V; Manufacturer: On Semi; Package: D-PAK-3; EDM-PN: *; Text2: *; Text1: *; Value: NCV8401BDTRKG; SAAB PN: *; Part Number: NCV8401BDTRKG; DCE Part No: *
footprint D-PAK-3 (D-Pak 6.73x6.22mm)
pins: 1 G, 2 D, 3 S

## NCV8401DTRKG_D-PAK
designator Q?, comment NCV8401DTRKG
FET N-Channel Low Side  Driver 33A 42V; Manufacturer: On Semi; Package: D-PAK-3; EDM-PN: *; Text2: *; Text1: *; Value: NCV8401DTRKG; Part Number: NCV8401DTRKG; SAAB PN: *; DCE Part No: *
footprint D-PAK-3 (D-Pak 6.73x6.22mm)
pins: 1 G, 2 D, 3 S

## NCV8402ASTT3G_SOT223
designator Q?, comment NCV8402ASTT3G
FET N-Channel Low Side  Driver 2A 42V; Manufacturer: On Semi; Package: SOT223; EDM-PN: *; Text2: *; Text1: *; Value: NCV8402ASTT3G; SAAB PN: *; Part Number: NCV8402ASTT3G; DCE Part No: *
footprint SOT223 (SOT223, 4-Leads, Body 6.7x7.3mm (max), Pitch 2.30mm, IPC Medium Density)
pins: 1 G, 2 D, 3 S, 4 D

## NDS352AP_SSOT-3
designator Q?, comment NDS352AP
FET P-Channel 900mA 30V; Manufacturer: Fairchild; Package: SuperSOT-3; EDM-PN: *; Text2: *; Text1: *; Value: NDS352AP; SAAB PN: *; Part Number: NDS352AP; DCE Part No: *
footprint SuperSOT-3 (SuperSot-3 2.92x2.4mm)
pins: 1 G, 2 S, 3 D

## NDS7002A_SOT23
designator Q?, comment NDS7002A
FET N-Channel 60V 280mA; Manufacturer: On Semi; Package: SOT23; EDM-PN: *; Text2: *; Text1: *; Value: NDS7002A; SAAB PN: *; Part Number: NDS7002A; DCE Part No: *
footprint SOT23 (SOT23, 3-Leads, Body 3.0x1.4mm (max), Pitch 0.95mm, IPC Medium Density)
pins: 1 G, 2 S, 3 D

## NDS8434_SO8
designator Q?, comment NDS8434
FET P-Channel 20V 6.5A; Manufacturer: On Semi; EDM-PN: FET184; Package: SO8; Text2: *; Text1: *; Value: NDS8434; SAAB PN: *; Part Number: NDS8434; DCE Part No: *
footprint SO8 (SOIC, 8-Leads, Body 5.0x4.0mm (max), Pitch 1.27mm, IPC Medium Density)
pins: 1, 2 S, 3 S, 4 G, 5 D, 6 D, 7 D, 8 D

## NDT3055L_SOT223
designator Q?, comment NDT3055L
FET N-Channel 4A 60V; Manufacturer: Fairchild; Package: SOT223; EDM-PN: *; Text2: *; Text1: *; Value: NDT3055L; Part Number: NDT3055L; SAAB PN: *; DCE Part No: *
footprint SOT223 (SOT223, 4-Leads, Body 6.7x7.3mm (max), Pitch 2.30mm, IPC Medium Density)
pins: 1 G, 2 D, 3 S, 4 D

## NSS12501UW3T2G_WDFN3
designator Q?, comment NSS12501UW3T2G
Transistor NPN Switching; Manufacturer: On Semi; Package: WDFN3-2X2; EDM-PN: *; Text2: *; Text1: *; Value: NSS12501UW3T2G; SAAB PN: *; Part Number: NSS12501UW3T2G; DCE Part No: *
footprint WDFN3-2X2 (Transistor 2x2mm SMD)
pins: 1 B, 2 E, 3 C

## NTD2955G_D-PAK
designator Q?, comment NTD2955G
FET P-Channel 60V 12A; Manufacturer: On Semi; Package: D-PAK; EDM-PN: *; Text2: *; Text1: *; Value: NTD2955G; SAAB PN: *; Part Number: NTD2955G; DCE Part No: *
footprint D-PAK (D-Pak 6.73x6.22mm)
pins: 1 G, 2 D, 3 S

## NTF6P02T3G_SOT223
designator Q?, comment NTF6P02T3G
FET P-Channel 20V 10A; Manufacturer: On Semi; EDM-PN: FET167; Package: SOT223; Text2: *; Text1: *; Value: NTF6P02T3G; SAAB PN: *; Part Number: NTF6P02T3G; DCE Part No: *
footprint SOT223 (SOT223, 4-Leads, Body 6.7x7.3mm (max), Pitch 2.30mm, IPC Medium Density)
pins: 1 G, 2 D, 3 S, 4 D

## NTF2955_SOT223
designator Q?, comment NTF2955
FET P-Channel 60V 2.6A; Manufacturer: On Semi; EDM-PN: FET62; Package: SOT223; Text2: *; Text1: *; Value: NTF2955; SAAB PN: *; Part Number: NTF2955; DCE Part No: *
footprint SOT223 (SOT223, 4-Leads, Body 6.7x7.3mm (max), Pitch 2.30mm, IPC Medium Density)
pins: 1 G, 2 D, 3 S, 4 D

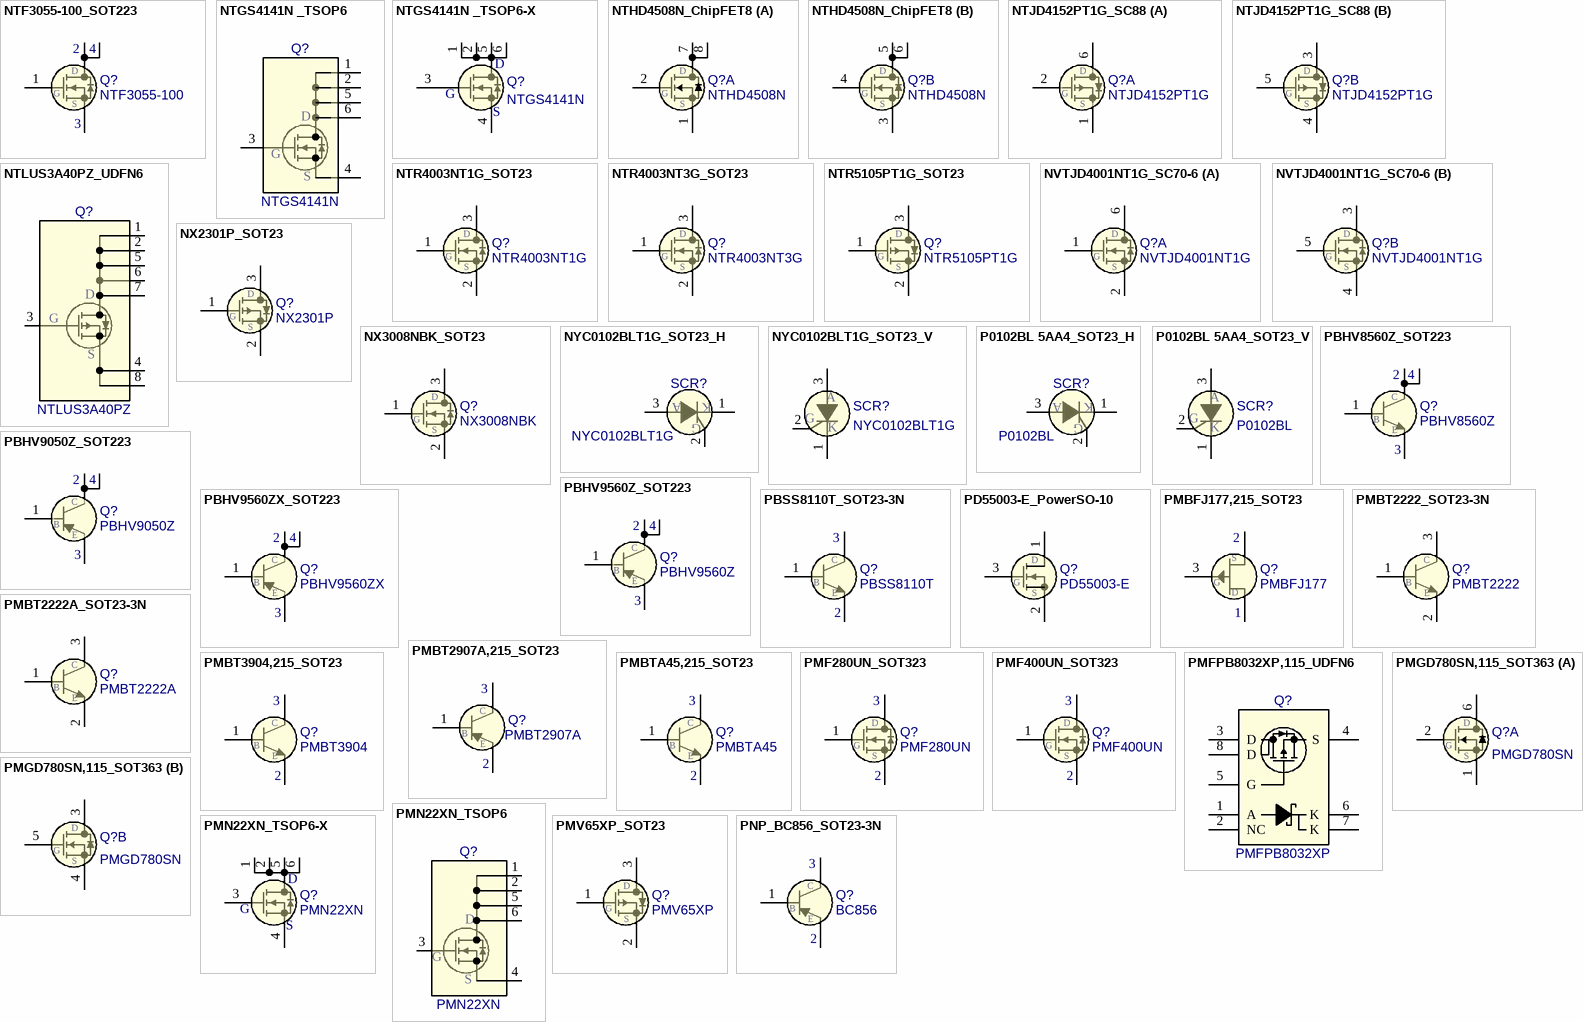
[diagram p8: symbols NTF3055-100_SOT223 to PNP_BC856_SOT23-3N]

## NTF3055-100_SOT223
designator Q?, comment NTF3055-100
FET N-Channel 60V 3A; Manufacturer: On Semi; EDM-PN: FET63; Package: SOT223; Text2: *; Text1: *; Value: NTF3055-100; SAAB PN: *; Part Number: NTF3055-100; DCE Part No: *
footprint SOT223 (SOT223, 4-Leads, Body 6.7x7.3mm (max), Pitch 2.30mm, IPC Medium Density)
pins: 1 G, 2 D, 3 S, 4 D

## NTGS4141N _TSOP6
designator Q?, comment NTGS4141N
FET N-Channel 7A 30V; Manufacturer: On Semi; Package: SO8; EDM-PN: *; Text2: *; Text1: *; Value: NTGS4141N; SAAB PN: *; Part Number: NTGS4141N; DCE Part No: *
footprint TSOP-6 (TSOP-6 3.0x1.5mm)
pins: 1 D, 2 D, 3 G, 4 S, 5 D, 6 D

## NTGS4141N _TSOP6-X
designator Q?, comment NTGS4141N
FET N-Channel 7A 30V; Manufacturer: On Semi; Package: SO8; EDM-PN: *; Text2: *; Text1: *; Value: NTGS4141N; SAAB PN: *; Part Number: NTGS4141N; DCE Part No: *
footprint TSOP-6 (TSOP-6 3.0x1.5mm)
pins: 1 D, 2 D, 3 G, 4 S, 5 D, 6 D